# Altium footprint library Inductors THD.PcbLib: 43 footprints (part 1 of 4)
Each footprint in its own frame and in the unit in brackets; x right, y up, seen from the top. Pads: shape width x height; smd on the part's side, far side on the other; paste and mask are expansions set on the pad; w line width, h text height; cw(c..) or ccw(c..) is an arc to the next point about the centre after c.
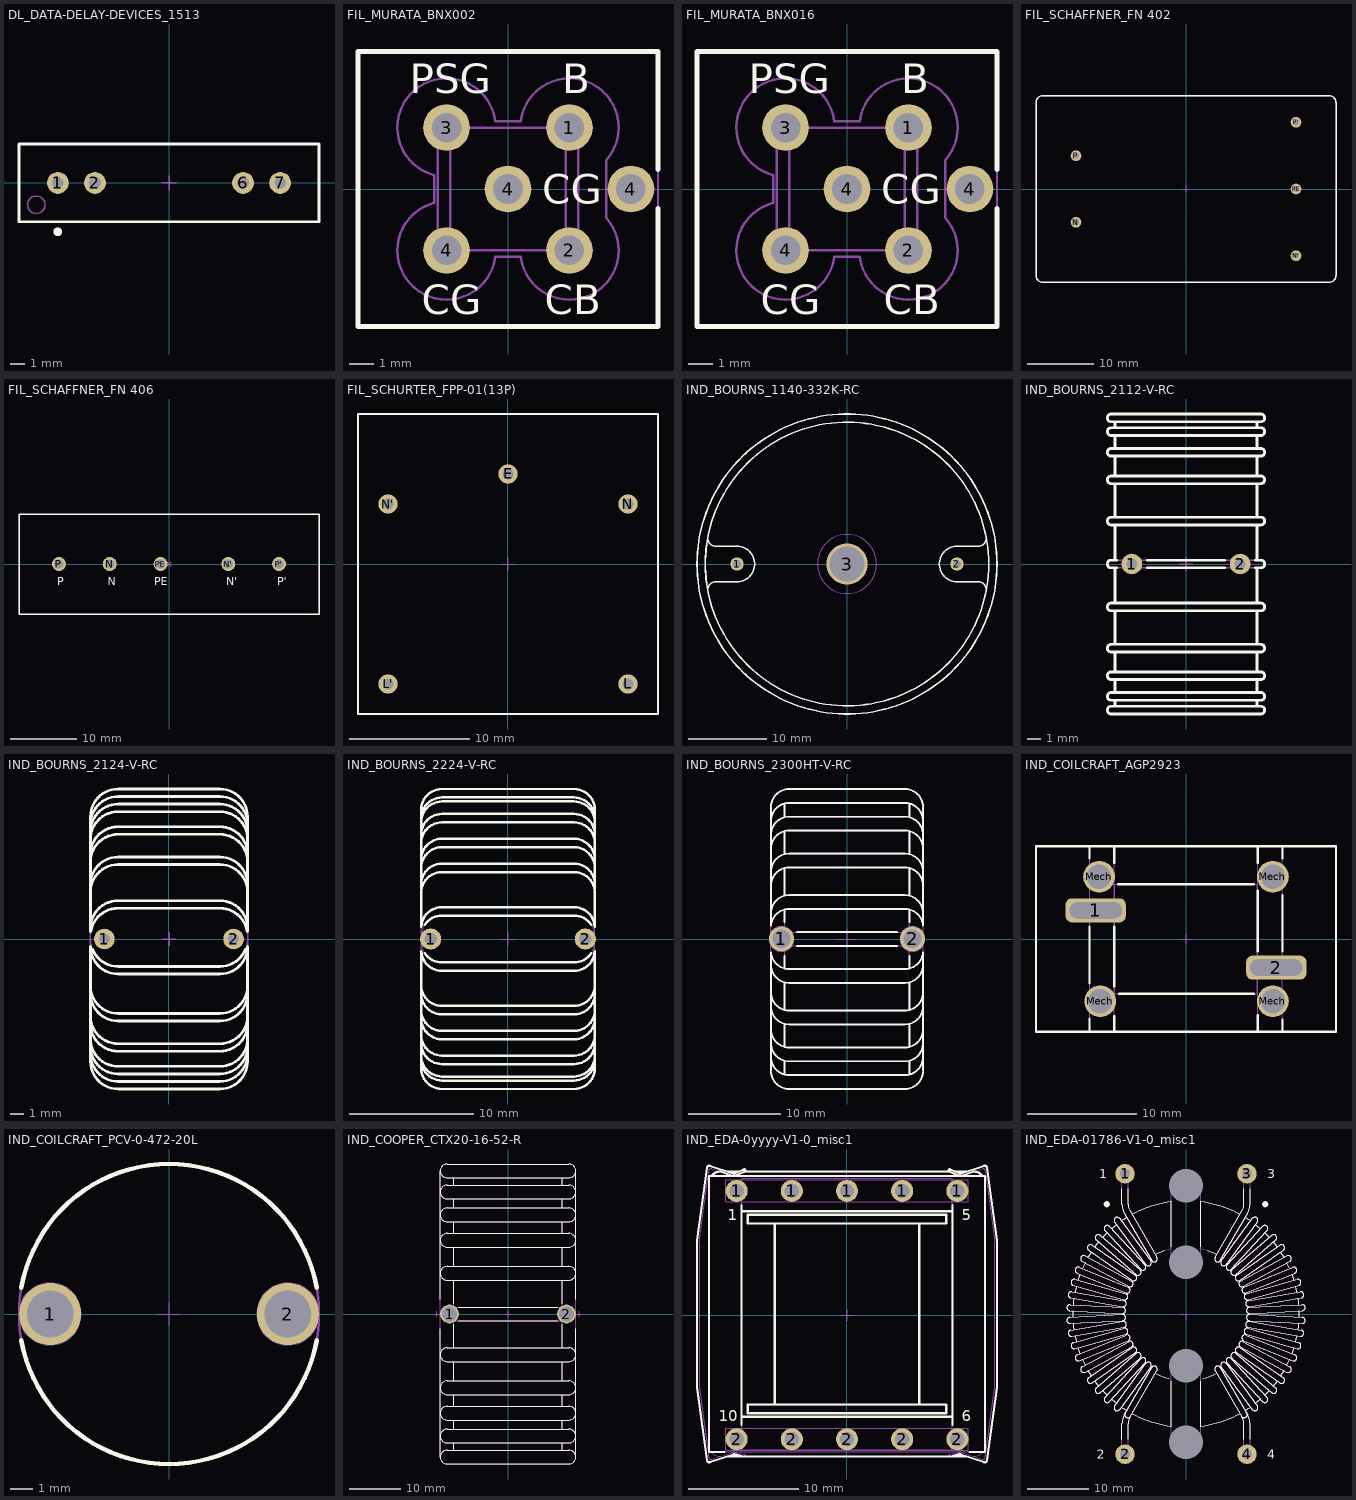
[diagram p0: the footprints below, top view; thin cyan lines are the x and y axes]

## DL_DATA-DELAY-DEVICES_1513 [mm] "Fixed SIP Delay Line 1513 Series"
height 7.11
pads (4):
  round 1.5 hole 0.8: 1(-7.62,0) 2(-5.08,0) 6(5.08,0) 7(7.62,0)
Top Overlay:
  circle w0.3: c-7.63,-3.35 r0.15
  lines w0.2: -10.287,-2.665 -10.287,2.665 10.287,2.665 10.287,-2.665 -10.287,-2.665
Mechanical 8:
  lines w0.1: -8.12,0 -7.62,0 ; -7.62,-0.5 -7.62,0 ; -7.62,0.5 -7.62,0 ; -7.12,0 -7.62,0 ; -5.58,0 -5.08,0 ; -5.08,-0.5 -5.08,0 ; -5.08,0.5 -5.08,0 ; -4.58,0 -5.08,0 ; -0.5,0 0,0 ; 0,-0.5 0,0 ; 0,0.5 0,0 ; 0.5,0 0,0 ; 4.58,0 5.08,0 ; 5.08,-0.5 5.08,0 ; 5.08,0.5 5.08,0 ; 5.58,0 5.08,0 ; 7.12,0 7.62,0 ; 7.62,-0.5 7.62,0 ; 7.62,0.5 7.62,0 ; 8.12,0 7.62,0
Mechanical 14:
  circle w0.1: c-9.1,-1.5 r0.6
  lines w0.1: -10.287,-2.665 10.287,-2.665 10.287,2.665 -10.287,2.665 -10.287,-2.665
3D body "DATA-DELAY-DEVICES_1513.stp": height 7.11, standoff -3.8, extent -10.287,-2.665 10.287,2.665

## FIL_MURATA_BNX002 [mm] "Block Type EMIFIL LC Combined Type, BNX002 Series"
height 13
pads (6):
  round 1.9 hole 1.2: 1(2.5,2.5) 2(2.5,-2.5) 3(-2.5,2.5) 4(-2.5,-2.5) 4(0,0) 4(5,0)
Top Overlay:
  lines w0.2: 6.1,-0.783 6.1,-5.6 -6.1,-5.6 -6.1,5.6 6.1,5.6 6.1,0.783
  text "B" at 2.2,3.9 h1.2
  text "CB" at 1.5,-5.1 h1.2
  text "CG" at -3.5,-5.1 h1.2
  text "PSG" at -4,3.9 h1.2
  text "CG" at 1.4,-0.6 h1.2
Mechanical 8:
  lines w0.1: -3,-2.5 -2.5,-2.5 ; -3,2.5 -2.5,2.5 ; -2.5,-3 -2.5,-2.5 ; -2.5,-2 -2.5,-2.5 ; -2.5,2 -2.5,2.5 ; -2.5,3 -2.5,2.5 ; -2,-2.5 -2.5,-2.5 ; -2,2.5 -2.5,2.5 ; -0.5,0 0,0 ; 0,-0.5 0,0 ; 0,0.5 0,0 ; 0.5,0 0,0 ; 2,-2.5 2.5,-2.5 ; 2,2.5 2.5,2.5 ; 2.5,-3 2.5,-2.5 ; 2.5,-2 2.5,-2.5 ; 2.5,2 2.5,2.5 ; 2.5,3 2.5,2.5 ; 3,-2.5 2.5,-2.5 ; 3,2.5 2.5,2.5 ; 4.5,0 5,0 ; 5,-0.5 5,0 ; 5,0.5 5,0 ; 5.5,0 5,0
Mechanical 14:
  lines w0.1: -2.35,-2.5 -2.35,2.5 ; 2.35,-2.5 2.35,2.473 ; -6.1,-5.6 -6.1,5.6 6.1,5.6 6.1,-5.6 -6.1,-5.6 ; -3,-0.564 ccw(c-2.5,-2.5) -0.516,-2.75 0.516,-2.75 ccw(c2.5,-2.5) 4,-1.177 4,1.177 ccw(c2.5,2.5) 0.516,2.75 -0.516,2.75 ccw(c-2.5,2.5) -3,0.564 -3,-0.564 ; -2.85,-2.5 -2.85,2.5 2.85,2.5 2.85,-2.5 -2.85,-2.5
3D body "FIL_MURATA_BNX002.stp": height 12.5, standoff -5, extent -6.1,-5.6 6.1,5.6

## FIL_MURATA_BNX016 [mm] "Block Type EMIFIL LC Combined Type, BNX01* Series"
height 8.5
pads (6):
  round 1.9 hole 1.2: 1(2.5,2.5) 2(2.5,-2.5) 3(-2.5,2.5) 4(-2.5,-2.5) 4(0,0) 4(5,0)
Top Overlay:
  lines w0.2: 6.1,-0.783 6.1,-5.6 -6.1,-5.6 -6.1,5.6 6.1,5.6 6.1,0.783
  text "B" at 2.2,3.9 h1.2
  text "CB" at 1.5,-5.1 h1.2
  text "CG" at -3.5,-5.1 h1.2
  text "PSG" at -4,3.9 h1.2
  text "CG" at 1.4,-0.6 h1.2
Mechanical 8:
  lines w0.1: -3,-2.5 -2.5,-2.5 ; -3,2.5 -2.5,2.5 ; -2.5,-3 -2.5,-2.5 ; -2.5,-2 -2.5,-2.5 ; -2.5,2 -2.5,2.5 ; -2.5,3 -2.5,2.5 ; -2,-2.5 -2.5,-2.5 ; -2,2.5 -2.5,2.5 ; -0.5,0 0,0 ; 0,-0.5 0,0 ; 0,0.5 0,0 ; 0.5,0 0,0 ; 2,-2.5 2.5,-2.5 ; 2,2.5 2.5,2.5 ; 2.5,-3 2.5,-2.5 ; 2.5,-2 2.5,-2.5 ; 2.5,2 2.5,2.5 ; 2.5,3 2.5,2.5 ; 3,-2.5 2.5,-2.5 ; 3,2.5 2.5,2.5 ; 4.5,0 5,0 ; 5,-0.5 5,0 ; 5,0.5 5,0 ; 5.5,0 5,0
Mechanical 14:
  lines w0.1: -2.35,-2.5 -2.35,2.5 ; 2.35,-2.5 2.35,2.473 ; -6.1,-5.6 6.1,-5.6 6.1,5.6 -6.1,5.6 -6.1,-5.6 ; -3,-0.564 ccw(c-2.5,-2.5) -0.516,-2.75 0.516,-2.75 ccw(c2.5,-2.5) 4,-1.177 4,1.177 ccw(c2.5,2.5) 0.516,2.75 -0.516,2.75 ccw(c-2.5,2.5) -3,0.564 -3,-0.564 ; -2.85,-2.5 2.85,-2.5 2.85,2.5 -2.85,2.5 -2.85,-2.5
3D body "FIL_MURATA_BNX016.stp": height 12, standoff -5, extent -6.1,-5.6 6.1,5.6

## FIL_SCHAFFNER_FN 402 [mm] "0.6 to 6.5A 250VAC Single Phase Low Cost PCB Filter (Body 45 x 28x 16.5mm)"
height 16.5
pads (5):
  round 1.6 hole 0.9: N(-16.5,-5) N'(16.5,-10) P(-16.5,5) P'(16.5,10) PE(16.5,0)
Top Overlay:
  lines w0.2: -22.5,-13 ccw(c-21.5,-13) -21.5,-14 21.5,-14 ccw(c21.5,-13) 22.5,-13 22.5,13 ccw(c21.5,13) 21.5,14 -21.5,14 ccw(c-21.5,13) -22.5,13 -22.5,-13
Mechanical 8:
  lines w0.1: -17,-5 -16.5,-5 ; -17,5 -16.5,5 ; -16.5,-5.5 -16.5,-5 ; -16.5,-4.5 -16.5,-5 ; -16.5,4.5 -16.5,5 ; -16.5,5.5 -16.5,5 ; -16,-5 -16.5,-5 ; -16,5 -16.5,5 ; -0.5,0 0,0 ; 0,-0.5 0,0 ; 0,0.5 0,0 ; 0.5,0 0,0 ; 16,-10 16.5,-10 ; 16,0 16.5,0 ; 16,10 16.5,10 ; 16.5,-10.5 16.5,-10 ; 16.5,-9.5 16.5,-10 ; 16.5,-0.5 16.5,0 ; 16.5,0.5 16.5,0 ; 16.5,9.5 16.5,10 ; 16.5,10.5 16.5,10 ; 17,-10 16.5,-10 ; 17,0 16.5,0 ; 17,10 16.5,10
Mechanical 14:
  lines w0.1: -20.5,14 -21.5,14 ; -21.5,14 ccw(c-21.5,13) -22.5,13 -22.5,-13 ccw(c-21.5,-13) -21.5,-14 21.5,-14 ccw(c21.5,-13) 22.5,-13 22.5,13 ccw(c21.5,13) 21.5,14 -21.5,14
3D body "FIL_SCHAFFNER_FN 402.stp": height 16.5, standoff -3.6, extent -22.5,-14 22.5,14

## FIL_SCHAFFNER_FN 406 [mm] "0.5 to 8.4A 250VAC Single Phase Ultra Compact EMC Filter (Body 45 x 15 x 28mm)"
height 28
pads (5):
  round 2.1 hole 1.4: N(-8.89,0) N'(8.89,0) P(-16.51,0) P'(16.51,0) PE(-1.27,0)
Top Overlay:
  lines w0.2: -22.5,-7.5 -22.5,7.5 22.5,7.5 22.5,-7.5 -22.5,-7.5
  text "P'" at 16.22,-3.2 h1.2
  text "N'" at 8.6,-3.2 h1.2
  text "PE" at -2.2,-3.2 h1.2
  text "N" at -9.18,-3.2 h1.2
  text "P" at -16.8,-3.2 h1.2
Mechanical 8:
  lines w0.1: -17.01,0 -16.51,0 ; -16.51,-0.5 -16.51,0 ; -16.51,0.5 -16.51,0 ; -16.01,0 -16.51,0 ; -9.39,0 -8.89,0 ; -8.89,-0.5 -8.89,0 ; -8.89,0.5 -8.89,0 ; -8.39,0 -8.89,0 ; -1.77,0 -1.27,0 ; -1.27,-0.5 -1.27,0 ; -1.27,0.5 -1.27,0 ; -0.77,0 -1.27,0 ; -0.354,-0.354 0,0 ; -0.354,0.354 0,0 ; 0.354,-0.354 0,0 ; 0.354,0.354 0,0 ; 8.39,0 8.89,0 ; 8.89,-0.5 8.89,0 ; 8.89,0.5 8.89,0 ; 9.39,0 8.89,0 ; 16.01,0 16.51,0 ; 16.51,-0.5 16.51,0 ; 16.51,0.5 16.51,0 ; 17.01,0 16.51,0
Mechanical 14:
  lines w0.1: -22.5,-7.5 -22.5,7.5 22.5,7.5 22.5,-7.5 -22.5,-7.5
3D body "FIL_SCHAFFNER_FN 406.stp": height 29.5, standoff -3.6, extent -22.5,-7.55 22.5,7.539

## FIL_SCHURTER_FPP-01(13P) [mm] "0.6 to 6.5A 250VAC Single Phase Low Cost PCB Filter (Body 45 x 28x 16.5mm)"
height 16.5
pads (5):
  round 1.6 hole 0.9: E(0,7.5) L(10,-10) L'(-10,-10) N(10,5) N'(-10,5)
Top Overlay:
  lines w0.2: -12.5,-12.5 -12.5,12.5 12.5,12.5 12.5,-12.5 -12.5,-12.5
Mechanical 8:
  lines w0.1: -10.5,-10 -10,-10 ; -10.5,5 -10,5 ; -10,-10.5 -10,-10 ; -10,-9.5 -10,-10 ; -10,4.5 -10,5 ; -10,5.5 -10,5 ; -9.5,-10 -10,-10 ; -9.5,5 -10,5 ; -0.5,0 0,0 ; -0.5,7.5 0,7.5 ; 0,-0.5 0,0 ; 0,0.5 0,0 ; 0,7 0,7.5 ; 0,8 0,7.5 ; 0.5,0 0,0 ; 0.5,7.5 0,7.5 ; 9.5,-10 10,-10 ; 9.5,5 10,5 ; 10,-10.5 10,-10 ; 10,-9.5 10,-10 ; 10,4.5 10,5 ; 10,5.5 10,5 ; 10.5,-10 10,-10 ; 10.5,5 10,5
Mechanical 14:
  lines w0.1: -12.5,-12.5 -12.5,12.5 12.5,12.5 12.5,-12.5 -12.5,-12.5
3D body "FIL_SCHURTER_FPP-01(13P).stp": height 25, standoff -3.8, extent -12.5,-12.5 12.5,12.5

## IND_BOURNS_1140-332K-RC [mm] "High Current Choke, Body Diameter 38.1mm Boby Height 26.162mm"
height 26.162
pads (3):
  round 1.7 hole 1: 1(-13.97,0) 2(13.97,0)
  round 5.2 / inner round 5.2 / far side round 7.5 hole 4.5: 3(0,0)
Top Overlay:
  circle w0.2: c0,0 r18
  circle w0.2: c0,0 r19.05
  lines w0.2: -17.668,-3.441 cw(c-16.686,-3.25) -16.686,-2.25 -13.97,-2.25 ccw(c-13.97,0) -13.97,2.25 -16.686,2.25 cw(c-16.686,3.25) -17.668,3.441 ; 17.668,-3.441 ccw(c16.686,-3.25) 16.686,-2.25 13.97,-2.25 cw(c13.97,0) 13.97,2.25 16.686,2.25 ccw(c16.686,3.25) 17.668,3.441
Mechanical 8:
  circle w0.1: c0,0 r3.75
  lines w0.1: -14.47,0 -13.97,0 ; -13.97,-0.5 -13.97,0 ; -13.97,0.5 -13.97,0 ; -13.47,0 -13.97,0 ; -0.5,0 0,0 ; 0,-0.5 0,0 ; 0,0.5 0,0 ; 0.5,0 0,0 ; 13.47,0 13.97,0 ; 13.97,-0.5 13.97,0 ; 13.97,0.5 13.97,0 ; 14.47,0 13.97,0
Mechanical 14:
  circle w0.1: c0,0 r18
  circle w0.1: c0,0 r2.25
  circle w0.1: c0,0 r19.05
  lines w0.1: -17.668,-3.441 cw(c-16.686,-3.25) -16.686,-2.25 -13.97,-2.25 ccw(c-13.97,0) -13.97,2.25 -16.686,2.25 cw(c-16.686,3.25) -17.668,3.441 ; 17.668,-3.441 ccw(c16.686,-3.25) 16.686,-2.25 13.97,-2.25 cw(c13.97,0) 13.97,2.25 16.686,2.25 ccw(c16.686,3.25) 17.668,3.441
3D body "IND_BOURNS_1140-332K-RC.stp": height 26.16, standoff -3.5, extent -19.05,-19.012 19.05,19.024

## IND_BOURNS_2112-V-RC [mm] "Vertical Leaded Toroidal Inductor Lead Spacing 7.87mm D21.84mm x W11.43mm"
height 21.84
pads (2):
  round 1.5 hole 0.8: 1(-3.937,0) 2(3.937,0)
Top Overlay:
  lines w0.2: -5.155,-10.34 -5.155,-9.9 ; -5.155,-9.34 -5.155,-8.4 ; -5.155,-7.84 -5.155,-6.4 ; -5.155,-5.84 -5.155,-3.4 ; -5.155,-2.84 -5.155,-0.28 ; -5.155,0.28 -5.155,2.84 ; -5.155,3.4 -5.155,5.84 ; -5.155,6.4 -5.155,7.84 ; -5.155,8.4 -5.155,9.34 ; -5.155,9.9 -5.155,10.34 ; -5.052,-0.28 -5.435,-0.28 cw(c-5.435,0) -5.435,0.28 -5.052,0.28 ; -2.822,-0.28 2.822,-0.28 ; -2.822,0.28 2.822,0.28 ; 5.052,-0.28 5.435,-0.28 ccw(c5.435,0) 5.435,0.28 ; 5.155,-10.34 5.155,-9.9 ; 5.155,-9.34 5.155,-8.4 ; 5.155,-7.84 5.155,-6.4 ; 5.155,-5.84 5.155,-3.4 ; 5.155,-2.84 5.155,-0.28 ; 5.155,0.28 5.155,2.84 ; 5.155,3.4 5.155,5.84 ; 5.155,6.4 5.155,7.84 ; 5.155,8.4 5.155,9.34 ; 5.155,9.9 5.155,10.34 ; 5.435,0.28 5.052,0.28 5.435,0.28 ; -5.435,-10.9 cw(c-5.435,-10.62) -5.435,-10.34 5.435,-10.34 cw(c5.435,-10.62) 5.435,-10.9 -5.435,-10.9 ; -5.435,-9.9 cw(c-5.435,-9.62) -5.435,-9.34 5.435,-9.34 cw(c5.435,-9.62) 5.435,-9.9 -5.435,-9.9 ; -5.435,-8.4 cw(c-5.435,-8.12) -5.435,-7.84 5.435,-7.84 cw(c5.435,-8.12) 5.435,-8.4 -5.435,-8.4 ; -5.435,-6.4 cw(c-5.435,-6.12) -5.435,-5.84 5.435,-5.84 cw(c5.435,-6.12) 5.435,-6.4 -5.435,-6.4 ; -5.435,-3.4 cw(c-5.435,-3.12) -5.435,-2.84 5.435,-2.84 cw(c5.435,-3.12) 5.435,-3.4 -5.435,-3.4 ; -5.435,2.84 cw(c-5.435,3.12) -5.435,3.4 5.435,3.4 cw(c5.435,3.12) 5.435,2.84 -5.435,2.84 ; -5.435,5.84 cw(c-5.435,6.12) -5.435,6.4 5.435,6.4 cw(c5.435,6.12) 5.435,5.84 -5.435,5.84 ; -5.435,7.84 cw(c-5.435,8.12) -5.435,8.4 5.435,8.4 cw(c5.435,8.12) 5.435,7.84 -5.435,7.84 ; -5.435,9.34 cw(c-5.435,9.62) -5.435,9.9 5.435,9.9 cw(c5.435,9.62) 5.435,9.34 -5.435,9.34 ; -5.435,10.34 cw(c-5.435,10.62) -5.435,10.9 5.435,10.9 cw(c5.435,10.62) 5.435,10.34 -5.435,10.34
Mechanical 8:
  lines w0.1: -4.437,0 -3.937,0 ; -3.937,-0.5 -3.937,0 ; -3.937,0.5 -3.937,0 ; -3.437,0 -3.937,0 ; -0.5,0 0,0 ; 0,-0.5 0,0 ; 0,0.5 0,0 ; 0.5,0 0,0 ; 3.437,0 3.937,0 ; 3.937,-0.5 3.937,0 ; 3.937,0.5 3.937,0 ; 4.437,0 3.937,0
Mechanical 14:
  lines w0.1: -5.155,-10.34 -5.155,-9.9 ; -5.155,-9.34 -5.155,-8.4 ; -5.155,-7.84 -5.155,-6.4 ; -5.155,-5.84 -5.155,-3.4 ; -5.155,-2.84 -5.155,-0.28 ; -5.155,0.28 -5.155,2.84 ; -5.155,3.4 -5.155,5.84 ; -5.155,6.4 -5.155,7.84 ; -5.155,8.4 -5.155,9.34 ; -5.155,9.9 -5.155,10.34 ; 5.155,-10.34 5.155,-9.9 ; 5.155,-9.34 5.155,-8.4 ; 5.155,-7.84 5.155,-6.4 ; 5.155,-5.84 5.155,-3.4 ; 5.155,-2.84 5.155,-0.28 ; 5.155,0.28 5.155,2.84 ; 5.155,3.4 5.155,5.84 ; 5.155,6.4 5.155,7.84 ; 5.155,8.4 5.155,9.34 ; 5.155,9.9 5.155,10.34 ; -5.435,-10.9 cw(c-5.435,-10.62) -5.435,-10.34 5.435,-10.34 cw(c5.435,-10.62) 5.435,-10.9 -5.435,-10.9 ; -5.435,-9.9 cw(c-5.435,-9.62) -5.435,-9.34 5.435,-9.34 cw(c5.435,-9.62) 5.435,-9.9 -5.435,-9.9 ; -5.435,-8.4 cw(c-5.435,-8.12) -5.435,-7.84 5.435,-7.84 cw(c5.435,-8.12) 5.435,-8.4 -5.435,-8.4 ; -5.435,-6.4 cw(c-5.435,-6.12) -5.435,-5.84 5.435,-5.84 cw(c5.435,-6.12) 5.435,-6.4 -5.435,-6.4 ; -5.435,-3.4 cw(c-5.435,-3.12) -5.435,-2.84 5.435,-2.84 cw(c5.435,-3.12) 5.435,-3.4 -5.435,-3.4 ; -5.435,-0.28 cw(c-5.435,0) -5.435,0.28 5.435,0.28 cw(c5.435,0) 5.435,-0.28 -5.435,-0.28 ; -5.435,2.84 cw(c-5.435,3.12) -5.435,3.4 5.435,3.4 cw(c5.435,3.12) 5.435,2.84 -5.435,2.84 ; -5.435,5.84 cw(c-5.435,6.12) -5.435,6.4 5.435,6.4 cw(c5.435,6.12) 5.435,5.84 -5.435,5.84 ; -5.435,7.84 cw(c-5.435,8.12) -5.435,8.4 5.435,8.4 cw(c5.435,8.12) 5.435,7.84 -5.435,7.84 ; -5.435,9.34 cw(c-5.435,9.62) -5.435,9.9 5.435,9.9 cw(c5.435,9.62) 5.435,9.34 -5.435,9.34 ; -5.435,10.34 cw(c-5.435,10.62) -5.435,10.9 5.435,10.9 cw(c5.435,10.62) 5.435,10.34 -5.435,10.34
3D body "IND_BOURNS_2112-V-RC.stp": height 21.8, standoff -3.32, extent -5.715,-10.9 5.715,10.9

## IND_BOURNS_2124-V-RC [mm] "Vertical Leaded Toroidal Inductor Lead Spacing  9.39mm D21.84mm x W11.43mm"
height 21.84
pads (2):
  round 1.5 hole 0.8: 1(-4.7,0) 2(4.7,0)
Top Overlay:
  lines w0.2: -5.715,-8.37 ccw(c-3.715,-8.37) -3.715,-10.37 3.715,-10.37 ccw(c3.715,-8.37) 5.715,-8.37 ; -5.715,-7.82 ccw(c-3.715,-7.82) -3.715,-9.82 3.715,-9.82 ccw(c3.715,-7.82) 5.715,-7.82 ; -5.715,-7.27 ccw(c-3.715,-7.27) -3.715,-9.27 3.715,-9.27 ccw(c3.715,-7.27) 5.715,-7.27 ; -5.715,-6.17 ccw(c-3.715,-6.17) -3.715,-8.17 3.715,-8.17 ccw(c3.715,-6.17) 5.715,-6.17 ; -5.715,-5.62 ccw(c-3.715,-5.62) -3.715,-7.62 3.715,-7.62 ccw(c3.715,-5.62) 5.715,-5.62 ; -5.715,-3.97 ccw(c-3.715,-3.97) -3.715,-5.97 3.715,-5.97 ccw(c3.715,-3.97) 5.715,-3.97 ; -5.715,-3.42 ccw(c-3.715,-3.42) -3.715,-5.42 3.715,-5.42 ccw(c3.715,-3.42) 5.715,-3.42 ; -5.715,-0.55 ccw(c-3.715,-0.55) -3.715,-2.55 3.715,-2.55 ccw(c3.715,-0.55) 5.715,-0.55 ; -5.715,-0.541 -5.715,-8.92 ccw(c-3.715,-8.92) -3.715,-10.92 3.715,-10.92 ccw(c3.715,-8.92) 5.715,-8.92 5.715,-0.541 ; -5.715,0.541 -5.715,8.92 cw(c-3.715,8.92) -3.715,10.92 3.715,10.92 cw(c3.715,8.92) 5.715,8.92 5.715,0.541 ; -5.715,0.79 cw(c-3.715,0.79) -3.715,2.79 3.715,2.79 cw(c3.715,0.79) 5.715,0.79 ; -5.715,3.42 cw(c-3.715,3.42) -3.715,5.42 3.715,5.42 cw(c3.715,3.42) 5.715,3.42 ; -5.715,3.97 cw(c-3.715,3.97) -3.715,5.97 3.715,5.97 cw(c3.715,3.97) 5.715,3.97 ; -5.715,5.62 cw(c-3.715,5.62) -3.715,7.62 3.715,7.62 cw(c3.715,5.62) 5.715,5.62 ; -5.715,6.17 cw(c-3.715,6.17) -3.715,8.17 3.715,8.17 cw(c3.715,6.17) 5.715,6.17 ; -5.715,7.27 cw(c-3.715,7.27) -3.715,9.27 3.715,9.27 cw(c3.715,7.27) 5.715,7.27 ; -5.715,7.82 cw(c-3.715,7.82) -3.715,9.82 3.715,9.82 cw(c3.715,7.82) 5.715,7.82 ; -5.715,8.37 cw(c-3.715,8.37) -3.715,10.37 3.715,10.37 cw(c3.715,8.37) 5.715,8.37 ; -5.683,0.597 cw(c-3.715,0.24) -3.715,2.24 3.715,2.24 cw(c3.715,0.24) 5.683,0.597 ; -5.567,-0.756 ccw(c-3.715,0) -3.715,-2 3.715,-2 ccw(c3.715,0) 5.567,-0.756
Mechanical 8:
  lines w0.1: -5.2,0 -4.7,0 ; -4.7,-0.5 -4.7,0 ; -4.7,0.5 -4.7,0 ; -4.2,0 -4.7,0 ; -0.5,0 0,0 ; 0,-0.5 0,0 ; 0,0.5 0,0 ; 0.5,0 0,0 ; 4.2,0 4.7,0 ; 4.7,-0.5 4.7,0 ; 4.7,0.5 4.7,0 ; 5.2,0 4.7,0
Mechanical 14:
  lines w0.1: -5.715,-8.37 ccw(c-3.715,-8.37) -3.715,-10.37 3.715,-10.37 ccw(c3.715,-8.37) 5.715,-8.37 ; -5.715,-7.82 ccw(c-3.715,-7.82) -3.715,-9.82 3.715,-9.82 ccw(c3.715,-7.82) 5.715,-7.82 ; -5.715,-7.27 ccw(c-3.715,-7.27) -3.715,-9.27 3.715,-9.27 ccw(c3.715,-7.27) 5.715,-7.27 ; -5.715,-6.17 ccw(c-3.715,-6.17) -3.715,-8.17 3.715,-8.17 ccw(c3.715,-6.17) 5.715,-6.17 ; -5.715,-5.62 ccw(c-3.715,-5.62) -3.715,-7.62 3.715,-7.62 ccw(c3.715,-5.62) 5.715,-5.62 ; -5.715,-3.97 ccw(c-3.715,-3.97) -3.715,-5.97 3.715,-5.97 ccw(c3.715,-3.97) 5.715,-3.97 ; -5.715,-3.42 ccw(c-3.715,-3.42) -3.715,-5.42 3.715,-5.42 ccw(c3.715,-3.42) 5.715,-3.42 ; -5.715,-0.55 ccw(c-3.715,-0.55) -3.715,-2.55 3.715,-2.55 ccw(c3.715,-0.55) 5.715,-0.55 ; -5.715,0 ccw(c-3.715,0) -3.715,-2 3.715,-2 ccw(c3.715,0) 5.715,0 ; -5.715,0.24 cw(c-3.715,0.24) -3.715,2.24 3.715,2.24 cw(c3.715,0.24) 5.715,0.24 ; -5.715,0.79 cw(c-3.715,0.79) -3.715,2.79 3.715,2.79 cw(c3.715,0.79) 5.715,0.79 ; -5.715,3.42 cw(c-3.715,3.42) -3.715,5.42 3.715,5.42 cw(c3.715,3.42) 5.715,3.42 ; -5.715,3.97 cw(c-3.715,3.97) -3.715,5.97 3.715,5.97 cw(c3.715,3.97) 5.715,3.97 ; -5.715,5.62 cw(c-3.715,5.62) -3.715,7.62 3.715,7.62 cw(c3.715,5.62) 5.715,5.62 ; -5.715,6.17 cw(c-3.715,6.17) -3.715,8.17 3.715,8.17 cw(c3.715,6.17) 5.715,6.17 ; -5.715,7.27 cw(c-3.715,7.27) -3.715,9.27 3.715,9.27 cw(c3.715,7.27) 5.715,7.27 ; -5.715,7.82 cw(c-3.715,7.82) -3.715,9.82 3.715,9.82 cw(c3.715,7.82) 5.715,7.82 ; -5.715,8.37 cw(c-3.715,8.37) -3.715,10.37 3.715,10.37 cw(c3.715,8.37) 5.715,8.37 ; -5.715,-8.92 ccw(c-3.715,-8.92) -3.715,-10.92 3.715,-10.92 ccw(c3.715,-8.92) 5.715,-8.92 5.715,8.92 ccw(c3.715,8.92) 3.715,10.92 -3.715,10.92 ccw(c-3.715,8.92) -5.715,8.92 -5.715,-8.92
3D body "IND_BOURNS_2124-V-RC.stp": height 21.83, standoff -3.32, extent -5.715,-10.91 5.715,10.911

## IND_BOURNS_2224-V-RC [mm] "Vertical Leaded Toroidal Inductor Lead Spacing  12.44mm D24.13mm x W13.97mm"
height 24.13
pads (2):
  round 1.7 hole 1: 1(-6.22,0) 2(6.22,0)
Top Overlay:
  lines w0.2: -6.985,-9.705 ccw(c-5.305,-9.705) -5.305,-11.385 5.305,-11.385 ccw(c5.305,-9.705) 6.985,-9.705 ; -6.985,-9.385 ccw(c-5.305,-9.385) -5.305,-11.065 5.305,-11.065 ccw(c5.305,-9.385) 6.985,-9.385 ; -6.985,-8.385 ccw(c-5.305,-8.385) -5.305,-10.065 5.305,-10.065 ccw(c5.305,-8.385) 6.985,-8.385 ; -6.985,-7.705 ccw(c-5.305,-7.705) -5.305,-9.385 5.305,-9.385 ccw(c5.305,-7.705) 6.985,-7.705 ; -6.985,-6.385 ccw(c-5.305,-6.385) -5.305,-8.065 5.305,-8.065 ccw(c5.305,-6.385) 6.985,-6.385 ; -6.985,-5.705 ccw(c-5.305,-5.705) -5.305,-7.385 5.305,-7.385 ccw(c5.305,-5.705) 6.985,-5.705 ; -6.985,-4.385 ccw(c-5.305,-4.385) -5.305,-6.065 5.305,-6.065 ccw(c5.305,-4.385) 6.985,-4.385 ; -6.985,-3.705 ccw(c-5.305,-3.705) -5.305,-5.385 5.305,-5.385 ccw(c5.305,-3.705) 6.985,-3.705 ; -6.985,-0.989 -6.985,-10.385 ccw(c-5.305,-10.385) -5.305,-12.065 5.305,-12.065 ccw(c5.305,-10.385) 6.985,-10.385 6.985,-0.989 ; -6.985,0.989 -6.985,10.385 cw(c-5.305,10.385) -5.305,12.065 5.305,12.065 cw(c5.305,10.385) 6.985,10.385 6.985,0.989 ; -6.985,3.705 cw(c-5.305,3.705) -5.305,5.385 5.305,5.385 cw(c5.305,3.705) 6.985,3.705 ; -6.985,4.385 cw(c-5.305,4.385) -5.305,6.065 5.305,6.065 cw(c5.305,4.385) 6.985,4.385 ; -6.985,5.705 cw(c-5.305,5.705) -5.305,7.385 5.305,7.385 cw(c5.305,5.705) 6.985,5.705 ; -6.985,6.385 cw(c-5.305,6.385) -5.305,8.065 5.305,8.065 cw(c5.305,6.385) 6.985,6.385 ; -6.985,7.705 cw(c-5.305,7.705) -5.305,9.385 5.305,9.385 cw(c5.305,7.705) 6.985,7.705 ; -6.985,8.385 cw(c-5.305,8.385) -5.305,10.065 5.305,10.065 cw(c5.305,8.385) 6.985,8.385 ; -6.985,9.385 cw(c-5.305,9.385) -5.305,11.065 5.305,11.065 cw(c5.305,9.385) 6.985,9.385 ; -6.985,9.705 cw(c-5.305,9.705) -5.305,11.385 5.305,11.385 cw(c5.305,9.705) 6.985,9.705 ; -6.982,-0.991 ccw(c-5.305,-0.885) -5.305,-2.565 5.305,-2.565 ccw(c5.305,-0.885) 6.982,-0.991 ; -6.982,0.991 cw(c-5.305,0.885) -5.305,2.565 5.305,2.565 cw(c5.305,0.885) 6.982,0.991 ; -6.688,-1.159 ccw(c-5.305,-0.205) -5.305,-1.885 5.305,-1.885 ccw(c5.305,-0.205) 6.688,-1.159 ; -6.688,1.159 cw(c-5.305,0.205) -5.305,1.885 5.305,1.885 cw(c5.305,0.205) 6.688,1.159
Mechanical 8:
  lines w0.1: -6.72,0 -6.22,0 ; -6.22,-0.5 -6.22,0 ; -6.22,0.5 -6.22,0 ; -5.72,0 -6.22,0 ; -0.5,0 0,0 ; 0,-0.5 0,0 ; 0,0.5 0,0 ; 0.5,0 0,0 ; 5.72,0 6.22,0 ; 6.22,-0.5 6.22,0 ; 6.22,0.5 6.22,0 ; 6.72,0 6.22,0
Mechanical 14:
  lines w0.1: -6.985,-9.705 ccw(c-5.305,-9.705) -5.305,-11.385 5.305,-11.385 ccw(c5.305,-9.705) 6.985,-9.705 ; -6.985,-9.385 ccw(c-5.305,-9.385) -5.305,-11.065 5.305,-11.065 ccw(c5.305,-9.385) 6.985,-9.385 ; -6.985,-8.385 ccw(c-5.305,-8.385) -5.305,-10.065 5.305,-10.065 ccw(c5.305,-8.385) 6.985,-8.385 ; -6.985,-7.705 ccw(c-5.305,-7.705) -5.305,-9.385 5.305,-9.385 ccw(c5.305,-7.705) 6.985,-7.705 ; -6.985,-6.385 ccw(c-5.305,-6.385) -5.305,-8.065 5.305,-8.065 ccw(c5.305,-6.385) 6.985,-6.385 ; -6.985,-5.705 ccw(c-5.305,-5.705) -5.305,-7.385 5.305,-7.385 ccw(c5.305,-5.705) 6.985,-5.705 ; -6.985,-4.385 ccw(c-5.305,-4.385) -5.305,-6.065 5.305,-6.065 ccw(c5.305,-4.385) 6.985,-4.385 ; -6.985,-3.705 ccw(c-5.305,-3.705) -5.305,-5.385 5.305,-5.385 ccw(c5.305,-3.705) 6.985,-3.705 ; -6.985,-0.885 ccw(c-5.305,-0.885) -5.305,-2.565 5.305,-2.565 ccw(c5.305,-0.885) 6.985,-0.885 ; -6.985,-0.205 ccw(c-5.305,-0.205) -5.305,-1.885 5.305,-1.885 ccw(c5.305,-0.205) 6.985,-0.205 ; -6.985,0.205 cw(c-5.305,0.205) -5.305,1.885 5.305,1.885 cw(c5.305,0.205) 6.985,0.205 ; -6.985,0.885 cw(c-5.305,0.885) -5.305,2.565 5.305,2.565 cw(c5.305,0.885) 6.985,0.885 ; -6.985,3.705 cw(c-5.305,3.705) -5.305,5.385 5.305,5.385 cw(c5.305,3.705) 6.985,3.705 ; -6.985,4.385 cw(c-5.305,4.385) -5.305,6.065 5.305,6.065 cw(c5.305,4.385) 6.985,4.385 ; -6.985,5.705 cw(c-5.305,5.705) -5.305,7.385 5.305,7.385 cw(c5.305,5.705) 6.985,5.705 ; -6.985,6.385 cw(c-5.305,6.385) -5.305,8.065 5.305,8.065 cw(c5.305,6.385) 6.985,6.385 ; -6.985,7.705 cw(c-5.305,7.705) -5.305,9.385 5.305,9.385 cw(c5.305,7.705) 6.985,7.705 ; -6.985,8.385 cw(c-5.305,8.385) -5.305,10.065 5.305,10.065 cw(c5.305,8.385) 6.985,8.385 ; -6.985,9.385 cw(c-5.305,9.385) -5.305,11.065 5.305,11.065 cw(c5.305,9.385) 6.985,9.385 ; -6.985,9.705 cw(c-5.305,9.705) -5.305,11.385 5.305,11.385 cw(c5.305,9.705) 6.985,9.705 ; -6.985,-10.385 ccw(c-5.305,-10.385) -5.305,-12.065 5.305,-12.065 ccw(c5.305,-10.385) 6.985,-10.385 6.985,10.385 ccw(c5.305,10.385) 5.305,12.065 -5.305,12.065 ccw(c-5.305,10.385) -6.985,10.385 -6.985,-10.385
3D body "IND_BOURNS_2224-V-RC.stp": height 24.13, standoff -3.32, extent -6.985,-12.065 6.985,12.065

## IND_BOURNS_2300HT-V-RC [mm] "Vertical Leaded Toroidal Inductor Lead Spacing  14.22mm D32.51mm x W16.51mm"
height 32.51
pads (2):
  round 2.7 hole 2: 1(-7.1,0.013) 2(7.1,0.013)
Top Overlay:
  lines w0.2: -8.255,-12.756 ccw(c-6.255,-12.756) -6.255,-14.756 6.255,-14.756 ccw(c6.255,-12.756) 8.255,-12.756 ; -8.255,-11.256 ccw(c-6.255,-11.256) -6.255,-13.256 6.255,-13.256 ccw(c6.255,-11.256) 8.255,-11.256 ; -8.255,-9.756 ccw(c-6.255,-9.756) -6.255,-11.756 6.255,-11.756 ccw(c6.255,-9.756) 8.255,-9.756 ; -8.255,-7.256 ccw(c-6.255,-7.256) -6.255,-9.256 6.255,-9.256 ccw(c6.255,-7.256) 8.255,-7.256 ; -8.255,-5.756 ccw(c-6.255,-5.756) -6.255,-7.756 6.255,-7.756 ccw(c6.255,-5.756) 8.255,-5.756 ; -8.255,-2.756 ccw(c-6.255,-2.756) -6.255,-4.756 6.255,-4.756 ccw(c6.255,-2.756) 8.255,-2.756 ; -8.255,-1.445 -8.255,-14.256 ccw(c-6.255,-14.256) -6.255,-16.256 6.255,-16.256 ccw(c6.255,-14.256) 8.255,-14.256 8.255,-1.445 ; -8.255,1.445 -8.255,14.256 cw(c-6.255,14.256) -6.255,16.256 6.255,16.256 cw(c6.255,14.256) 8.255,14.256 8.255,1.445 ; -8.255,2.756 cw(c-6.255,2.756) -6.255,4.756 6.255,4.756 cw(c6.255,2.756) 8.255,2.756 ; -8.255,5.756 cw(c-6.255,5.756) -6.255,7.756 6.255,7.756 cw(c6.255,5.756) 8.255,5.756 ; -8.255,7.256 cw(c-6.255,7.256) -6.255,9.256 6.255,9.256 cw(c6.255,7.256) 8.255,7.256 ; -8.255,9.756 cw(c-6.255,9.756) -6.255,11.756 6.255,11.756 cw(c6.255,9.756) 8.255,9.756 ; -8.255,11.256 cw(c-6.255,11.256) -6.255,13.256 6.255,13.256 cw(c6.255,11.256) 8.255,11.256 ; -8.255,12.756 cw(c-6.255,12.756) -6.255,14.756 6.255,14.756 cw(c6.255,12.756) 8.255,12.756 ; -8.245,-1.453 ccw(c-6.255,-1.256) -6.255,-3.256 6.255,-3.256 ccw(c6.255,-1.256) 8.245,-1.453 ; -8.245,1.453 cw(c-6.255,1.256) -6.255,3.256 6.255,3.256 cw(c6.255,1.256) 8.245,1.453 ; -6.755,-14.692 -6.755,-13.192 ; -6.755,-11.692 -6.755,-9.192 ; -6.755,-7.692 -6.755,-4.692 ; -6.755,-3.192 -6.755,-1.818 ; -6.755,1.818 -6.755,3.192 ; -6.755,4.692 -6.755,7.692 ; -6.755,9.192 -6.755,11.692 ; -6.755,13.192 -6.755,14.692 ; -5.409,-0.75 5.409,-0.75 ; -5.409,0.75 5.409,0.75 ; 6.755,-14.692 6.755,-13.192 ; 6.755,-11.692 6.755,-9.192 ; 6.755,-7.692 6.755,-4.692 ; 6.755,-3.192 6.755,-1.818 ; 6.755,1.818 6.755,3.192 ; 6.755,4.692 6.755,7.692 ; 6.755,9.192 6.755,11.692 ; 6.755,13.192 6.755,14.692
Mechanical 8:
  circle w0.1: c7.1,0 r1.35
  circle w0.1: c7.1,0 r1
  circle w0.1: c-7.1,0 r1.35
  circle w0.1: c-7.1,0 r1
  lines w0.1: -8.1,0.013 -7.1,0.013 ; -7.1,-0.987 -7.1,0.013 ; -7.1,1.013 -7.1,0.013 ; -6.1,0.013 -7.1,0.013 ; -1,0 0,0 ; 0,-1 0,0 ; 0,1 0,0 ; 1,0 0,0 ; 6.1,0.013 7.1,0.013 ; 7.1,-0.987 7.1,0.013 ; 7.1,1.013 7.1,0.013 ; 8.1,0.013 7.1,0.013
Mechanical 14:
  lines w0.1: -8.255,-12.756 ccw(c-6.255,-12.756) -6.255,-14.756 6.255,-14.756 ccw(c6.255,-12.756) 8.255,-12.756 ; -8.255,-11.256 ccw(c-6.255,-11.256) -6.255,-13.256 6.255,-13.256 ccw(c6.255,-11.256) 8.255,-11.256 ; -8.255,-9.756 ccw(c-6.255,-9.756) -6.255,-11.756 6.255,-11.756 ccw(c6.255,-9.756) 8.255,-9.756 ; -8.255,-7.256 ccw(c-6.255,-7.256) -6.255,-9.256 6.255,-9.256 ccw(c6.255,-7.256) 8.255,-7.256 ; -8.255,-5.756 ccw(c-6.255,-5.756) -6.255,-7.756 6.255,-7.756 ccw(c6.255,-5.756) 8.255,-5.756 ; -8.255,-2.756 ccw(c-6.255,-2.756) -6.255,-4.756 6.255,-4.756 ccw(c6.255,-2.756) 8.255,-2.756 ; -8.255,-1.256 ccw(c-6.255,-1.256) -6.255,-3.256 6.255,-3.256 ccw(c6.255,-1.256) 8.255,-1.256 ; -8.255,1.256 cw(c-6.255,1.256) -6.255,3.256 6.255,3.256 cw(c6.255,1.256) 8.255,1.256 ; -8.255,2.756 cw(c-6.255,2.756) -6.255,4.756 6.255,4.756 cw(c6.255,2.756) 8.255,2.756 ; -8.255,5.756 cw(c-6.255,5.756) -6.255,7.756 6.255,7.756 cw(c6.255,5.756) 8.255,5.756 ; -8.255,7.256 cw(c-6.255,7.256) -6.255,9.256 6.255,9.256 cw(c6.255,7.256) 8.255,7.256 ; -8.255,9.756 cw(c-6.255,9.756) -6.255,11.756 6.255,11.756 cw(c6.255,9.756) 8.255,9.756 ; -8.255,11.256 cw(c-6.255,11.256) -6.255,13.256 6.255,13.256 cw(c6.255,11.256) 8.255,11.256 ; -8.255,12.756 cw(c-6.255,12.756) -6.255,14.756 6.255,14.756 cw(c6.255,12.756) 8.255,12.756 ; -6.755,-14.692 -6.755,-13.192 ; -6.755,-11.692 -6.755,-9.192 ; -6.755,-7.692 -6.755,-4.692 ; -6.755,-3.192 -6.755,-0.75 ; -6.755,0.75 -6.755,3.192 ; -6.755,4.692 -6.755,7.692 ; -6.755,9.192 -6.755,11.692 ; -6.755,13.192 -6.755,14.692 ; 6.755,-14.692 6.755,-13.192 ; 6.755,-11.692 6.755,-9.192 ; 6.755,-7.692 6.755,-4.692 ; 6.755,-3.192 6.755,-0.75 ; 6.755,0.75 6.755,3.192 ; 6.755,4.692 6.755,7.692 ; 6.755,9.192 6.755,11.692 ; 6.755,13.192 6.755,14.692 ; -8.255,-14.256 ccw(c-6.255,-14.256) -6.255,-16.256 6.255,-16.256 ccw(c6.255,-14.256) 8.255,-14.256 8.255,14.256 ccw(c6.255,14.256) 6.255,16.256 -6.255,16.256 ccw(c-6.255,14.256) -8.255,14.256 -8.255,-14.256 ; -7.505,-0.75 cw(c-7.505,0) -7.505,0.75 7.505,0.75 cw(c7.505,0) 7.505,-0.75 -7.505,-0.75
3D body "IND_BOURNS_2300HT-V-RC.stp": height 32.51, standoff -3.8, extent -8.343,-16.254 8.287,16.255

## IND_COILCRAFT_AGP2923 [mm] "AGP2923 Series, SMD Inductor  Body Width 19.97mm Body Lenght 27.43mm Height 23.75mm"
height 23.75
pads (6):
  rrect50% 5.5x2.2 hole 1.5 slot 4.8 at 0 deg: 1(-8.255,2.615) 2(8.255,-2.615)
  round 2.9 hole 2.2: Mech(-7.95,5.69) Mech(-7.85,-5.69) Mech(7.95,-5.69) Mech(7.95,5.69)
Top Overlay:
  lines w0.2: -8.815,-8.485 -8.815,-7.298 ; -8.815,-4.082 -8.815,1.145 ; -8.815,7.354 -8.815,8.485 ; -6.565,-8.485 -6.565,-7.055 ; -6.565,-4.325 -6.565,1.145 ; -6.565,6.954 -6.565,8.47 ; -6.207,5 6.207,5 ; -6.107,-5 6.207,-5 ; 6.565,-8.47 6.565,-6.954 ; 6.565,-1.145 6.565,4.426 ; 6.565,6.954 6.565,8.485 ; 8.815,-8.485 8.815,-7.354 ; 8.815,-1.145 8.815,4.026 ; 8.815,7.354 8.815,8.485 ; -13.715,-8.485 -13.715,8.485 13.715,8.485 13.715,-8.485 -13.715,-8.485
Mechanical 8:
  circle w0.1: c-7.85,-5.69 r1.12
  circle w0.1: c7.95,-5.69 r1.12
  circle w0.1: c7.95,5.69 r1.12
  circle w0.1: c-7.95,5.69 r1.12
  lines w0.1: -8.755,2.615 -8.255,2.615 ; -8.45,5.69 -7.95,5.69 ; -8.35,-5.69 -7.85,-5.69 ; -8.255,2.115 -8.255,2.615 ; -8.255,3.115 -8.255,2.615 ; -7.95,5.19 -7.95,5.69 ; -7.95,6.19 -7.95,5.69 ; -7.85,-6.19 -7.85,-5.69 ; -7.85,-5.19 -7.85,-5.69 ; -7.755,2.615 -8.255,2.615 ; -7.45,5.69 -7.95,5.69 ; -7.35,-5.69 -7.85,-5.69 ; -0.5,0 0,0 ; 0,-0.5 0,0 ; 0,0.5 0,0 ; 0.5,0 0,0 ; 7.45,-5.69 7.95,-5.69 ; 7.45,5.69 7.95,5.69 ; 7.755,-2.615 8.255,-2.615 ; 7.95,-6.19 7.95,-5.69 ; 7.95,-5.19 7.95,-5.69 ; 7.95,5.19 7.95,5.69 ; 7.95,6.19 7.95,5.69 ; 8.255,-3.115 8.255,-2.615 ; 8.255,-2.115 8.255,-2.615 ; 8.45,-5.69 7.95,-5.69 ; 8.45,5.69 7.95,5.69 ; 8.755,-2.615 8.255,-2.615 ; -10.67,1.845 -10.67,3.385 -5.84,3.385 -5.84,1.845 -10.67,1.845 ; 5.84,-3.385 5.84,-1.845 10.67,-1.845 10.67,-3.385 5.84,-3.385
Mechanical 14:
  lines w0.1: -8.815,-8.485 -8.815,8.485 ; -6.565,-8.485 -6.565,8.47 ; 6.565,-8.47 6.565,8.485 ; 8.815,-8.485 8.815,8.485 ; -13.715,-8.485 -13.715,8.485 13.715,8.485 13.715,-8.485 -13.715,-8.485 ; -6.504,-5 -6.504,5 6.504,5 6.504,-5 -6.504,-5
3D body "IND_COILCRAFT_AGP29238.stp": height 23.75, standoff -3.8, extent -13.715,-8.485 13.715,8.485

## IND_COILCRAFT_PCV-0-472-20L [mm] "Radial Leaded Wire Wound Inductor D=13.5mm"
height 30.5
pads (2):
  round 2.8 hole 2.1: 1(-5.35,0) 2(5.35,0)
Top Overlay:
  lines w0.2: -6.647,-1.175 ccw(c0,0) 6.647,-1.175 ; -6.647,1.175 cw(c0,0) 6.647,1.175
Mechanical 8:
  circle w0.05: c-5.35,0 r1.05
  circle w0.05: c-5.35,0 r1.4
  circle w0.05: c5.35,0 r1.05
  circle w0.05: c5.35,0 r1.4
  lines w0.05: -5.85,0 -5.35,0 ; -5.35,-0.5 -5.35,0 ; -5.35,0.5 -5.35,0 ; -4.85,0 -5.35,0 ; -0.5,0 0,0 ; 0,-0.5 0,0 ; 0,0.5 0,0 ; 0.5,0 0,0 ; 4.85,0 5.35,0 ; 5.35,-0.5 5.35,0 ; 5.35,0.5 5.35,0 ; 5.85,0 5.35,0
Mechanical 14:
  circle w0.1: c0,0 r6.75
3D body "IND_COILCRAFT_PCV-0-472-20L.stp": height 30.5, standoff -6.6, extent -6.75,-6.75 6.75,6.75

## IND_COOPER_CTX20-16-52-R [mm] "Vertical Leaded Toroidal Inductor Lead Spacing 23mm D59mm x W28mm"
height 59
pads (2):
  round 3.7 hole 3: 1(-11.5,0) 2(11.5,0)
Top Overlay:
  lines w0.2: -13.325,-28.15 -13.325,-2.923 ; -13.325,2.923 -13.325,28.15 ; -10.625,-26.8 -10.625,-25.35 ; -10.625,-22.65 -10.625,-20.85 ; -10.625,-18.15 -10.625,-15.85 ; -10.625,-13.15 -10.625,-9.35 ; -10.625,-6.65 -10.625,-2.019 ; -10.625,2.019 -10.625,6.65 ; -10.625,9.35 -10.625,13.15 ; -10.625,15.85 -10.625,18.15 ; -10.625,20.85 -10.625,22.65 ; -10.625,25.35 -10.625,26.8 ; -9.763,-1.35 9.763,-1.35 ; -9.763,1.35 9.763,1.35 ; 10.625,-26.8 10.625,-25.35 ; 10.625,-22.65 10.625,-20.85 ; 10.625,-18.15 10.625,-15.85 ; 10.625,-13.15 10.625,-9.35 ; 10.625,-6.65 10.625,-2.019 ; 10.625,2.019 10.625,6.65 ; 10.625,9.35 10.625,13.15 ; 10.625,15.85 10.625,18.15 ; 10.625,20.85 10.625,22.65 ; 10.625,25.35 10.625,26.8 ; 13.325,-28.15 13.325,-2.923 ; 13.325,2.923 13.325,28.15 ; -11.975,-29.5 cw(c-11.975,-28.15) -11.975,-26.8 11.975,-26.8 cw(c11.975,-28.15) 11.975,-29.5 -11.975,-29.5 ; -11.975,-25.35 cw(c-11.975,-24) -11.975,-22.65 11.975,-22.65 cw(c11.975,-24) 11.975,-25.35 -11.975,-25.35 ; -11.975,-20.85 cw(c-11.975,-19.5) -11.975,-18.15 11.975,-18.15 cw(c11.975,-19.5) 11.975,-20.85 -11.975,-20.85 ; -11.975,-15.85 cw(c-11.975,-14.5) -11.975,-13.15 11.975,-13.15 cw(c11.975,-14.5) 11.975,-15.85 -11.975,-15.85 ; -11.975,-9.35 cw(c-11.975,-8) -11.975,-6.65 11.975,-6.65 cw(c11.975,-8) 11.975,-9.35 -11.975,-9.35 ; -11.975,6.65 cw(c-11.975,8) -11.975,9.35 11.975,9.35 cw(c11.975,8) 11.975,6.65 -11.975,6.65 ; -11.975,13.15 cw(c-11.975,14.5) -11.975,15.85 11.975,15.85 cw(c11.975,14.5) 11.975,13.15 -11.975,13.15 ; -11.975,18.15 cw(c-11.975,19.5) -11.975,20.85 11.975,20.85 cw(c11.975,19.5) 11.975,18.15 -11.975,18.15 ; -11.975,22.65 cw(c-11.975,24) -11.975,25.35 11.975,25.35 cw(c11.975,24) 11.975,22.65 -11.975,22.65 ; -11.975,26.8 cw(c-11.975,28.15) -11.975,29.5 11.975,29.5 cw(c11.975,28.15) 11.975,26.8 -11.975,26.8
Mechanical 8:
  lines w0.1: -14.5,0 -14,0 ; -14,-0.5 -14,0 ; -14,0.5 -14,0 ; -13.5,0 -14,0 ; -0.5,0 0,0 ; 0,-0.5 0,0 ; 0,0.5 0,0 ; 0.5,0 0,0 ; 13.5,0 14,0 ; 14,-0.5 14,0 ; 14,0.5 14,0 ; 14.5,0 14,0
Mechanical 14:
  lines w0.1: -13.325,-28.15 -13.325,28.15 ; -10.625,-26.8 -10.625,-25.35 ; -10.625,-22.65 -10.625,-20.85 ; -10.625,-18.15 -10.625,-15.85 ; -10.625,-13.15 -10.625,-9.35 ; -10.625,-6.65 -10.625,-1.35 ; -10.625,1.35 -10.625,6.65 ; -10.625,9.35 -10.625,13.15 ; -10.625,15.85 -10.625,18.15 ; -10.625,20.85 -10.625,22.65 ; -10.625,25.35 -10.625,26.8 ; 10.625,-26.8 10.625,-25.35 ; 10.625,-22.65 10.625,-20.85 ; 10.625,-18.15 10.625,-15.85 ; 10.625,-13.15 10.625,-9.35 ; 10.625,-6.65 10.625,-1.35 ; 10.625,1.35 10.625,6.65 ; 10.625,9.35 10.625,13.15 ; 10.625,15.85 10.625,18.15 ; 10.625,20.85 10.625,22.65 ; 10.625,25.35 10.625,26.8 ; 13.325,-28.15 13.325,28.15 ; -11.975,-29.5 cw(c-11.975,-28.15) -11.975,-26.8 11.975,-26.8 cw(c11.975,-28.15) 11.975,-29.5 -11.975,-29.5 ; -11.975,-25.35 cw(c-11.975,-24) -11.975,-22.65 11.975,-22.65 cw(c11.975,-24) 11.975,-25.35 -11.975,-25.35 ; -11.975,-20.85 cw(c-11.975,-19.5) -11.975,-18.15 11.975,-18.15 cw(c11.975,-19.5) 11.975,-20.85 -11.975,-20.85 ; -11.975,-15.85 cw(c-11.975,-14.5) -11.975,-13.15 11.975,-13.15 cw(c11.975,-14.5) 11.975,-15.85 -11.975,-15.85 ; -11.975,-9.35 cw(c-11.975,-8) -11.975,-6.65 11.975,-6.65 cw(c11.975,-8) 11.975,-9.35 -11.975,-9.35 ; -11.975,-1.35 cw(c-11.975,0) -11.975,1.35 11.975,1.35 cw(c11.975,0) 11.975,-1.35 -11.975,-1.35 ; -11.975,6.65 cw(c-11.975,8) -11.975,9.35 11.975,9.35 cw(c11.975,8) 11.975,6.65 -11.975,6.65 ; -11.975,13.15 cw(c-11.975,14.5) -11.975,15.85 11.975,15.85 cw(c11.975,14.5) 11.975,13.15 -11.975,13.15 ; -11.975,18.15 cw(c-11.975,19.5) -11.975,20.85 11.975,20.85 cw(c11.975,19.5) 11.975,18.15 -11.975,18.15 ; -11.975,22.65 cw(c-11.975,24) -11.975,25.35 11.975,25.35 cw(c11.975,24) 11.975,22.65 -11.975,22.65 ; -11.975,26.8 cw(c-11.975,28.15) -11.975,29.5 11.975,29.5 cw(c11.975,28.15) 11.975,26.8 -11.975,26.8
3D body "IND_COOPER_CTX20-16-52-R.stp": height 59, standoff -3.8, extent -14,-29.5 14,29.5

## IND_EDA-0yyyy-V1-0_misc1 [mm] "see EDA-0yyyy-V1-0 _misc1"
height 12.9
pads (10):
  round 2 hole 1.3: 1(-10,11.25) 1(-5,11.25) 1(0,11.25) 1(5,11.25) 1(10,11.25) 2(-10,-11.25) 2(-5,-11.25) 2(0,-11.25) 2(5,-11.25) 2(10,-11.25)
Top Overlay:
  lines w0.2: -12.3,12.6 cw(c-11.5,12) -11.5,13 -11.482,13 -10.313,12.61 ccw(c-10.25,12.8) -10.169,12.617 -9.269,13.017 ccw(c-9.309,13.109) -9.35,13.2 -10.179,12.832 cw(c-10.26,13.014) -10.324,12.825 -12.421,13.524 ccw(c-12.485,13.334) -12.683,13.361 -13.588,6.758 ccw(c-13.389,6.731) -13.589,6.731 -13.589,-6.531 ccw(c-13.389,-6.531) -13.588,-6.558 -12.683,-13.161 ccw(c-12.485,-13.134) -12.421,-13.324 -10.303,-12.618 cw(c-10.239,-12.807) -10.196,-12.612 -9.35,-12.8 -10.85,-12.8 ; -11.1,-12.4 -12.5,-12.4 -12.5,12.6 12.5,12.6 12.5,-12.4 11.1,-12.4 ; -10.85,13 -9.8,13 ; -9.55,-9.95 -9.55,9.95 ; -9.55,-9.2 9.55,-9.2 ; -9.55,9.4 9.55,9.4 ; -9.308,13 9.308,13 ; -9.307,-12.8 9.307,-12.8 ; -6.55,-8.1 -6.55,8.3 ; 6.55,-8.1 6.55,8.3 ; 9.55,-9.95 9.55,9.95 ; 9.8,13 10.85,13 ; 10.85,-12.8 9.35,-12.8 10.196,-12.612 cw(c10.239,-12.807) 10.303,-12.618 12.421,-13.324 ccw(c12.485,-13.134) 12.683,-13.161 13.588,-6.558 ccw(c13.39,-6.531) 13.59,-6.531 13.59,6.731 ccw(c13.39,6.731) 13.588,6.758 12.683,13.361 ccw(c12.485,13.334) 12.421,13.524 10.324,12.825 cw(c10.26,13.014) 10.179,12.832 9.35,13.2 ccw(c9.309,13.109) 9.269,13.017 10.169,12.617 ccw(c10.25,12.8) 10.313,12.61 11.498,13.005 ; 11.483,13 11.5,13 cw(c11.5,12) 12.3,12.6 ; -9,-8.9 9,-8.9 9,-8.1 -9,-8.1 -9,-8.9 ; -9,8.3 9,8.3 9,9.1 -9,9.1 -9,8.3
  text "1" at -10.8,8.6 h1
  text "5" at 10.4,8.6 h1
  text "6" at 10.4,-9.6 h1
  text "10" at -11.6,-9.6 h1
Mechanical 8:
  lines w0.1: -10.5,-11.25 -10,-11.25 ; -10.5,11.25 -10,11.25 ; -10,-11.75 -10,-11.25 ; -10,-10.75 -10,-11.25 ; -10,10.75 -10,11.25 ; -10,11.75 -10,11.25 ; -9.5,-11.25 -10,-11.25 ; -9.5,11.25 -10,11.25 ; -5.5,-11.25 -5,-11.25 ; -5.5,11.25 -5,11.25 ; -5,-11.75 -5,-11.25 ; -5,-10.75 -5,-11.25 ; -5,10.75 -5,11.25 ; -5,11.75 -5,11.25 ; -4.5,-11.25 -5,-11.25 ; -4.5,11.25 -5,11.25 ; -0.5,-11.25 0,-11.25 ; -0.5,0 0,0 ; -0.5,11.25 0,11.25 ; 0,-11.75 0,-11.25 ; 0,-10.75 0,-11.25 ; 0,-0.5 0,0 ; 0,0.5 0,0 ; 0,10.75 0,11.25 ; 0,11.75 0,11.25 ; 0.5,-11.25 0,-11.25 ; 0.5,0 0,0 ; 0.5,11.25 0,11.25 ; 4.5,-11.25 5,-11.25 ; 4.5,11.25 5,11.25 ; 5,-11.75 5,-11.25 ; 5,-10.75 5,-11.25 ; 5,10.75 5,11.25 ; 5,11.75 5,11.25 ; 5.5,-11.25 5,-11.25 ; 5.5,11.25 5,11.25 ; 9.5,-11.25 10,-11.25 ; 9.5,11.25 10,11.25 ; 10,-11.75 10,-11.25 ; 10,-10.75 10,-11.25 ; 10,10.75 10,11.25 ; 10,11.75 10,11.25 ; 10.5,-11.25 10,-11.25 ; 10.5,11.25 10,11.25 ; -11,-12.25 11,-12.25 11,-10.25 -11,-10.25 -11,-12.25 ; -11,10.25 11,10.25 11,12.25 -11,12.25 -11,10.25
Mechanical 14:
  lines w0.1: -12.3,-12.4 ccw(c-11.5,-11.8) -11.5,-12.8 -11.482,-12.8 ; -12.3,12.6 cw(c-11.5,12) -11.5,13 -11.482,13 ; -10.85,-12.8 -9.35,-12.8 ; -10.85,13 -9.8,13 ; -9.55,-9.2 9.55,-9.2 ; -9.55,9.4 9.55,9.4 ; -9.308,13 9.308,13 ; -9.307,-12.8 9.307,-12.8 ; -6.55,-8.1 -6.55,8.3 ; 6.55,-8.1 6.55,8.3 ; 9.8,13 10.85,13 ; 10.85,-12.8 9.35,-12.8 ; 11.483,-12.8 11.5,-12.8 ccw(c11.5,-11.8) 12.3,-12.4 ; 11.483,13 11.5,13 cw(c11.5,12) 12.3,12.6 ; -9.35,-12.8 ccw(c-9.328,-12.702) -9.307,-12.605 -10.207,-12.405 ccw(c-10.25,-12.6) -10.313,-12.41 -12.256,-13.058 cw(c-12.319,-12.868) -12.517,-12.895 -13.386,-6.558 cw(c-13.188,-6.53) -13.388,-6.531 -13.406,6.597 cw(c-13.206,6.598) -13.404,6.625 -12.517,13.095 cw(c-12.319,13.068) -12.256,13.258 -10.313,12.61 ccw(c-10.25,12.8) -10.169,12.617 -9.269,13.017 ccw(c-9.309,13.109) -9.35,13.2 -10.179,12.832 cw(c-10.26,13.014) -10.324,12.825 -12.421,13.524 ccw(c-12.485,13.334) -12.683,13.361 -13.588,6.758 ccw(c-13.389,6.731) -13.589,6.731 -13.589,-6.531 ccw(c-13.389,-6.531) -13.588,-6.558 -12.683,-13.161 ccw(c-12.485,-13.134) -12.421,-13.324 -10.303,-12.618 cw(c-10.239,-12.807) -10.196,-12.612 -9.35,-12.8 ; 9.35,-12.8 cw(c9.328,-12.702) 9.307,-12.605 10.207,-12.405 cw(c10.25,-12.6) 10.313,-12.41 12.256,-13.058 ccw(c12.319,-12.868) 12.517,-12.895 13.386,-6.558 ccw(c13.188,-6.53) 13.388,-6.531 13.406,6.598 ccw(c13.206,6.598) 13.404,6.625 12.517,13.095 ccw(c12.319,13.068) 12.256,13.258 10.313,12.61 cw(c10.25,12.8) 10.169,12.617 9.269,13.017 cw(c9.309,13.109) 9.35,13.2 10.179,12.832 ccw(c10.26,13.014) 10.324,12.825 12.421,13.524 cw(c12.485,13.334) 12.683,13.361 13.588,6.758 cw(c13.39,6.731) 13.59,6.731 13.59,-6.531 cw(c13.39,-6.531) 13.588,-6.558 12.683,-13.161 cw(c12.485,-13.134) 12.421,-13.324 10.303,-12.618 ccw(c10.239,-12.807) 10.196,-12.612 9.35,-12.8 ; -12.5,-12.4 12.5,-12.4 12.5,12.6 -12.5,12.6 -12.5,-12.4 ; -9.55,-12.2 9.55,-12.2 9.55,12.4 -9.55,12.4 -9.55,-12.2 ; -9,-8.9 9,-8.9 9,-8.1 -9,-8.1 -9,-8.9 ; -9,8.3 9,8.3 9,9.1 -9,9.1 -9,8.3
Multi-Layer:
  lines w2: -10,-11.25 10,-11.25 ; -10,11.25 10,11.25
3D body "IND_EDA-0yyyy-V1-0_misc1.stp": height 12.9, standoff -3.5, extent -13.589,-13.333 13.59,13.534

## IND_EDA-01786-V1-0_misc1 [mm] "see EDA-01786-V1-0_misc1"
height 33.8
pads (8):
  round 3.2 hole 1.6: 1(-10,23) 2(-10,-23) 3(10,23) 4(10,-23)
  round 1 hole 5.5 unplated mask+2.25: 5(0,-21) 5(0,-8.5) 5(0,8.5) 5(0,21)
Top Overlay:
  drawing of 226 lines, arcs and shapes, not listed
  text "1" at -14.238,22.25 h1.5
  text "3" at 13.333,22.25 h1.5
  text "2" at -14.667,-23.75 h1.5
  text "4" at 13.286,-23.75 h1.5
Mechanical 8:
  lines w0.1: -11,-23 -10,-23 -10,-24 ; -11,23 -10,23 -10,22 ; -1,-21 0,-21 0,-22 ; -1,-8.5 0,-8.5 0,-9.5 ; -1,0 0,0 0,-1 ; -1,8.5 0,8.5 0,7.5 ; -1,21 0,21 0,20 ; 9,-23 10,-23 10,-24 ; 9,23 10,23 10,22
Mechanical 14:
  drawing of 244 lines, arcs and shapes, not listed
3D body "IND_EDA-01786-V1-0_misc1.stp": height 33.8, standoff -7.2, extent -19.54,-23.5 19.54,23.5